# Altium footprint library PcbLib_Discrete.PcbLib: 118 footprints (part 1 of 8)
Each footprint in its own frame and in the unit in brackets; x right, y up, seen from the top. Pads: shape width x height; smd on the part's side, far side on the other; paste and mask are expansions set on the pad; w line width, h text height; cw(c..) or ccw(c..) is an arc to the next point about the centre after c.
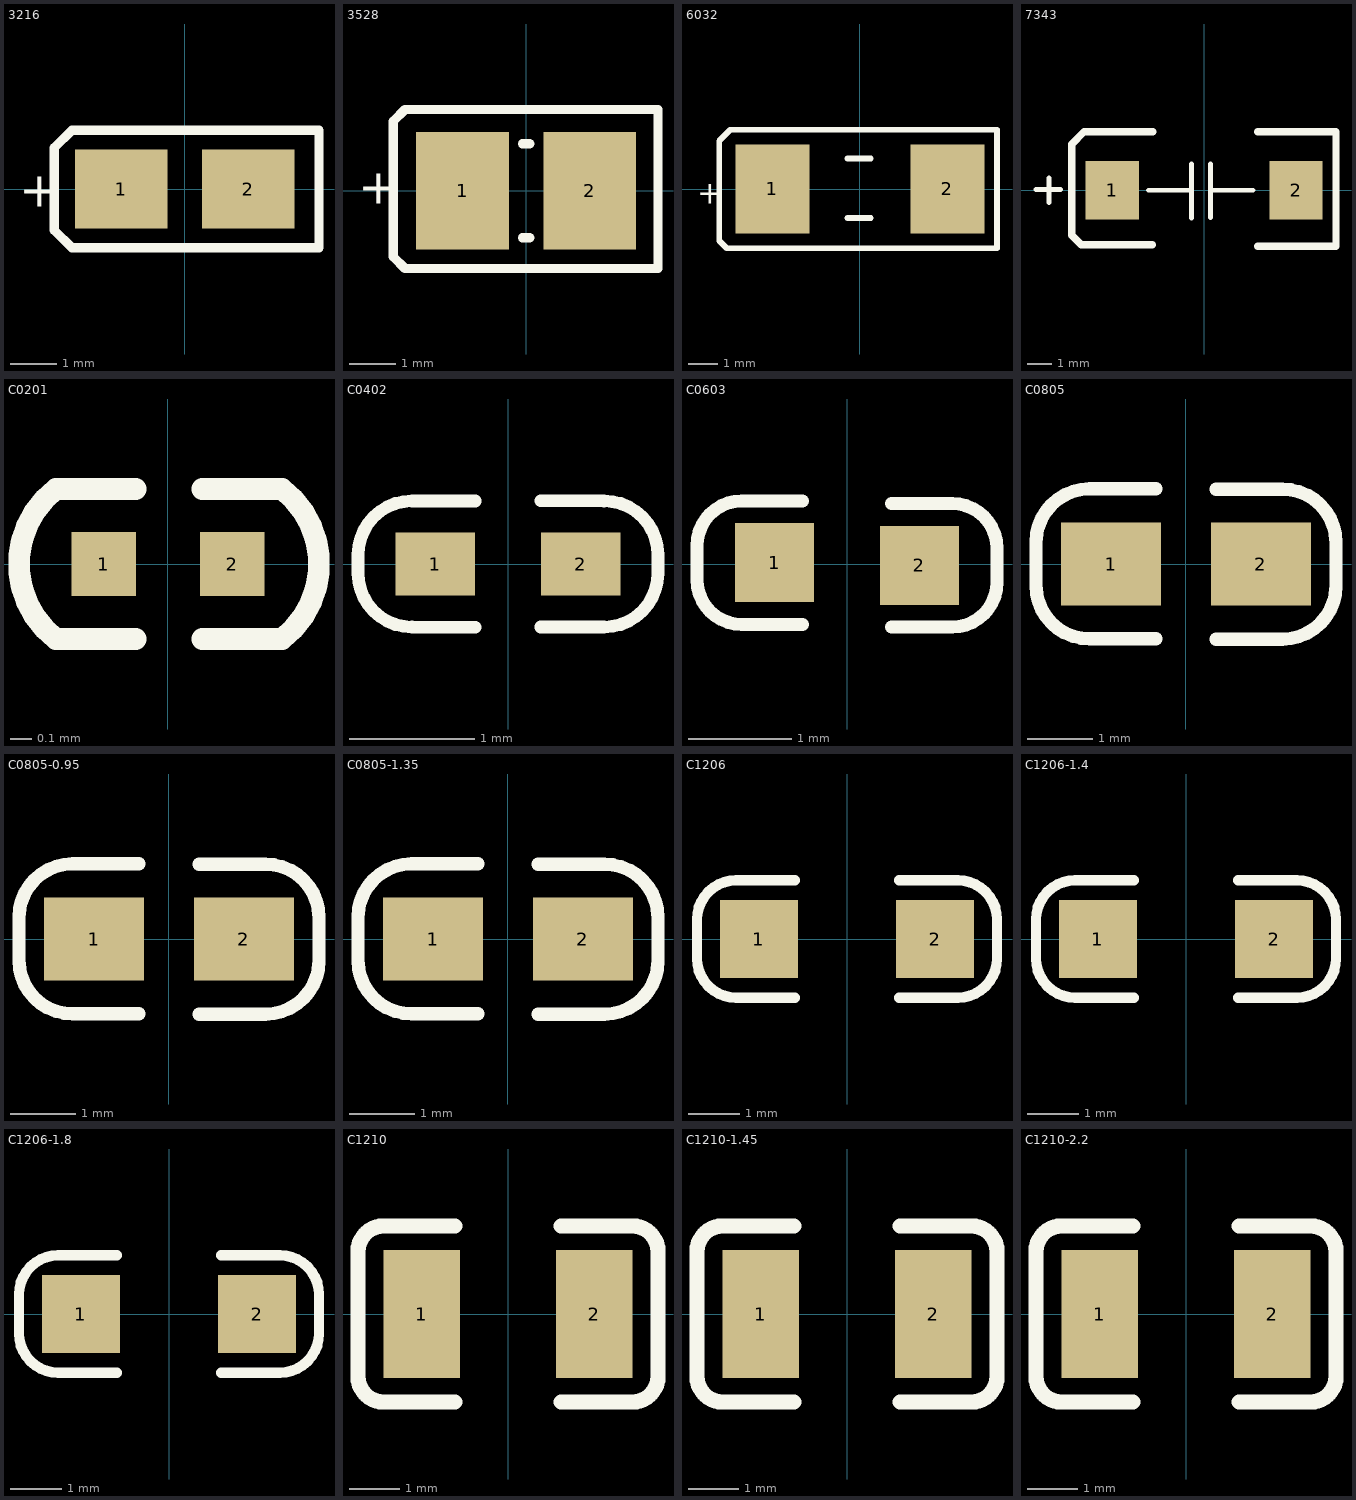
[diagram p0: the footprints below, top view; thin cyan lines are the x and y axes]

## 3216 [mm] "TAJ-A"
pads (2):
  rect 2x1.7 smd: 1(-1.373,0) 2(1.373,0)
Top Overlay:
  lines w0.2: 2.897,-1.016 2.897,1.27 -2.437,1.27 -2.818,0.889 -2.818,-0.889 -2.437,-1.27 2.897,-1.27 2.897,1.016
  text "+" at -3.58,-0.381 h0.76
3D body "TAJ-A.STEP": height 1.6, standoff 0, extent -1.6,-0.8 1.6,0.8

## 3528 [mm] "TAJ-B"
pads (2):
  rect 2x2.54 smd: 1(-1.373,0) 2(1.373,0)
Top Overlay:
  lines w0.2: -0.076,-1.016 0.076,-1.016 ; -0.076,1.016 0.076,1.016 ; -2.868,-1.422 -2.868,1.499 -2.614,1.753 2.847,1.753 2.847,-1.676 -2.614,-1.676 -2.868,-1.422
  text "+" at -3.63,-0.279 h0.76
3D body "TAJ-B.STEP": height 1.9, standoff 0, extent -1.75,-1.4 1.75,1.4

## 6032 [mil] "TAJ-C"
pads (2):
  rect 100x120 smd: 1(-118.1,0.01) 2(118.12,0.01)
Top Overlay:
  lines w7.87: -17,-39 14.5,-39 ; -17,41 14.5,41 ; -190,-70 -190,65 -175,80 185,80 185,34 185,-80 -180,-80 -190,-70
  text "+" at -220,-20 h30
3D body "TAJ-C.STEP": height 102.36, standoff 0, extent -118.1,-62.98 118.12,63

## 7343 [mm] "TAJ-D"
pads (2):
  rect 2.2x2.4 smd: 1(-3.797,0) 2(3.797,0)
Top Overlay:
  lines w0.2: -6.947,0.025 -5.931,0.025 ; -6.413,-0.508 -6.413,0.508
  lines w0.203: -2.299,0 -0.521,0 ; -0.521,-1.143 -0.521,1.077 ; 0.258,-1.135 0.258,1.085 ; 0.258,0 2.019,0
  lines w0.305: -2.146,-2.249 -5.079,-2.249 -5.474,-1.854 -5.474,1.905 -4.966,2.413 -2.121,2.413 ; 2.21,-2.311 5.448,-2.311 5.448,2.413 2.21,2.413
3D body "TAJ-D.STEP": height 2.9, standoff 0, extent -3.65,-2.15 3.65,2.15

## C0201 [mm]
pads (2):
  rect 0.3x0.3 smd: 1(-0.3,0) 2(0.3,0)
Top Overlay:
  lines w0.102: -0.15,-0.35 -0.523,-0.35 cw(c-0.254,0) -0.523,0.35 -0.15,0.35 ; 0.16,-0.35 0.533,-0.35 ccw(c0.264,0) 0.533,0.35 0.16,0.35
3D body "CAP 0201.STEP": height 0.29, standoff -0.01, extent -0.3,-0.15 0.3,0.15

## C0402 [mil]
pads (2):
  rect 25x20 smd: 1(-23,0) 2(23,0)
Top Overlay:
  lines w4: -10.34,-19.92 -30.34,-19.92 cw(c-30.34,-2.89) -47.37,-2.89 -47.37,2.89 cw(c-30.34,2.89) -30.34,19.92 -10.34,19.91 ; 10.34,-19.91 30.34,-19.92 ccw(c30.34,-2.89) 47.37,-2.89 47.37,2.89 ccw(c30.34,2.89) 30.34,19.92 10.34,19.92
3D body "CAP 0402.STEP": height 20.63, standoff 0, extent -19.68,-10.31 19.69,10.32

## C0603 [mil]
pads (2):
  rect 30x30 smd: 1(-27.5,0.5) 2(27.5,-0.5)
Top Overlay:
  lines w5: -17,-23 -40,-23 cw(c-40,-5.97) -57.03,-5.97 -57.03,6.97 cw(c-40,6.97) -40,24 -17,24 ; 17,-24 40,-24 ccw(c40,-6.97) 57.03,-6.97 57.03,5.97 ccw(c40,5.97) 40,23 17,23
3D body "CAP 0603.STEP": height 32.44, standoff 0, extent -32.21,-15.72 30.79,16.72

## C0805 [mil] "0.75"
pads (2):
  rect 60x50 smd: 1(-45,0) 2(45,0)
Top Overlay:
  lines w8: -90.14,-12.86 ccw(c-58,-12.86) -58,-45 -18,-45 ; -90.14,-11.86 -90.14,13 cw(c-58,13) -58,45.14 -18,45.14 ; 18,-45.14 58,-45.14 ccw(c58,-13) 90.14,-13 90.14,11.86 ; 18,45 58,45 cw(c58,12.86) 90.14,12.86
3D body "CAP 0805.STEP": height 50.16, standoff 0, extent -39.37,-25.08 39.37,25.08

## C0805-0.95 [mil]
pads (2):
  rect 60x50 smd: 1(-45,0) 2(45,0)
Top Overlay:
  lines w8: -90.14,-12.86 ccw(c-58,-12.86) -58,-45 -18,-45 ; -90.14,-11.86 -90.14,13 cw(c-58,13) -58,45.14 -18,45.14 ; 18,-45.14 58,-45.14 ccw(c58,-13) 90.14,-13 90.14,11.86 ; 18,45 58,45 cw(c58,12.86) 90.14,12.86
3D body "CAPC-0805-T0.95-BN.stp": height 37.4, standoff 0, extent -41.34,-26.58 41.34,26.58

## C0805-1.35 [mil]
pads (2):
  rect 60x50 smd: 1(-45,0) 2(45,0)
Top Overlay:
  lines w8: -90.14,-12.86 ccw(c-58,-12.86) -58,-45 -18,-45 ; -90.14,-11.86 -90.14,13 cw(c-58,13) -58,45.14 -18,45.14 ; 18,-45.14 58,-45.14 ccw(c58,-13) 90.14,-13 90.14,11.86 ; 18,45 58,45 cw(c58,12.86) 90.14,12.86
3D body "CAPC-0805-T1.35-BN.stp": height 53.15, standoff 0, extent -41.34,-26.58 41.34,26.58

## C1206 [mil] "1.0"
pads (2):
  rect 60x60 smd: 1(-67.5,0) 2(67.5,0)
Top Overlay:
  lines w7.99: -115,-15 -115,15 ; -85,-45 -40,-45 ; -85,45 -40,45 ; 40,-45 85,-45 ; 40,45 85,45 ; 115,-15 115,15
  lines w8: -115,-15 ccw(c-85,-15) -85,-45 ; -115,15 cw(c-85,15) -85,45 ; 85,-45 ccw(c85,-15) 115,-15 ; 85,45 cw(c85,15) 115,15
3D body "CAP 1206-0.8mm.STEP": height 31.5, standoff 0, extent -62.99,-31.5 62.99,31.5

## C1206-1.4 [mil]
pads (2):
  rect 60x60 smd: 1(-67.5,0) 2(67.5,0)
Top Overlay:
  lines w7.99: -115,-15 -115,15 ; -85,-45 -40,-45 ; -85,45 -40,45 ; 40,-45 85,-45 ; 40,45 85,45 ; 115,-15 115,15
  lines w8: -115,-15 ccw(c-85,-15) -85,-45 ; -115,15 cw(c-85,15) -85,45 ; 85,-45 ccw(c85,-15) 115,-15 ; 85,45 cw(c85,15) 115,15
3D body "CAP 1206-1.4mm.STEP": height 55.12, standoff 0, extent -62.99,-31.49 63,31.5

## C1206-1.8 [mil]
pads (2):
  rect 60x60 smd: 1(-67.5,0) 2(67.5,0)
Top Overlay:
  lines w7.99: -115,-15 -115,15 ; -85,-45 -40,-45 ; -85,45 -40,45 ; 40,-45 85,-45 ; 40,45 85,45 ; 115,-15 115,15
  lines w8: -115,-15 ccw(c-85,-15) -85,-45 ; -115,15 cw(c-85,15) -85,45 ; 85,-45 ccw(c85,-15) 115,-15 ; 85,45 cw(c85,15) 115,15
3D body "CAP 1206-1.8mm.STEP": height 70.87, standoff 0, extent -62.99,-31.5 62.99,31.5

## C1210 [mil] "1.8"
pads (2):
  rect 60x100 smd: 1(-67.5,0) 2(67.5,0)
Top Overlay:
  lines w12: -41.45,-68.95 -97.47,-68.95 cw(c-97.47,-48.95) -117.47,-48.95 -117.47,48.95 cw(c-97.47,48.95) -97.47,68.95 -41.45,68.95 ; 41.45,-68.95 97.47,-68.95 ccw(c97.47,-48.95) 117.47,-48.95 117.47,48.95 ccw(c97.47,48.95) 97.47,68.95 41.45,68.95
3D body "CAP 1210-1.8mm.STEP": height 70.87, standoff 0, extent -62.99,-49.21 62.99,49.22

## C1210-1.45 [mil] "1.8"
pads (2):
  rect 60x100 smd: 1(-67.5,0) 2(67.5,0)
Top Overlay:
  lines w12: -41.45,-68.95 -97.47,-68.95 cw(c-97.47,-48.95) -117.47,-48.95 -117.47,48.95 cw(c-97.47,48.95) -97.47,68.95 -41.45,68.95 ; 41.45,-68.95 97.47,-68.95 ccw(c97.47,-48.95) 117.47,-48.95 117.47,48.95 ccw(c97.47,48.95) 97.47,68.95 41.45,68.95
3D body "CAP 1210-1mm.STEP": height 39.37, standoff 0, extent -62.99,-49.21 62.99,49.21

## C1210-2.2 [mil] "1.8"
pads (2):
  rect 60x100 smd: 1(-67.5,0) 2(67.5,0)
Top Overlay:
  lines w12: -41.45,-68.95 -97.47,-68.95 cw(c-97.47,-48.95) -117.47,-48.95 -117.47,48.95 cw(c-97.47,48.95) -97.47,68.95 -41.45,68.95 ; 41.45,-68.95 97.47,-68.95 ccw(c97.47,-48.95) 117.47,-48.95 117.47,48.95 ccw(c97.47,48.95) 97.47,68.95 41.45,68.95
3D body "CAP 1210-2.8mm.STEP": height 110.24, standoff 0, extent -62.99,-49.21 62.99,49.21